# Altium footprint library PcbLib3.PcbLib: 13 footprints
Each footprint in its own frame and in the unit in brackets; x right, y up, seen from the top. Pads: shape width x height; smd on the part's side, far side on the other; paste and mask are expansions set on the pad; w line width, h text height; cw(c..) or ccw(c..) is an arc to the next point about the centre after c.
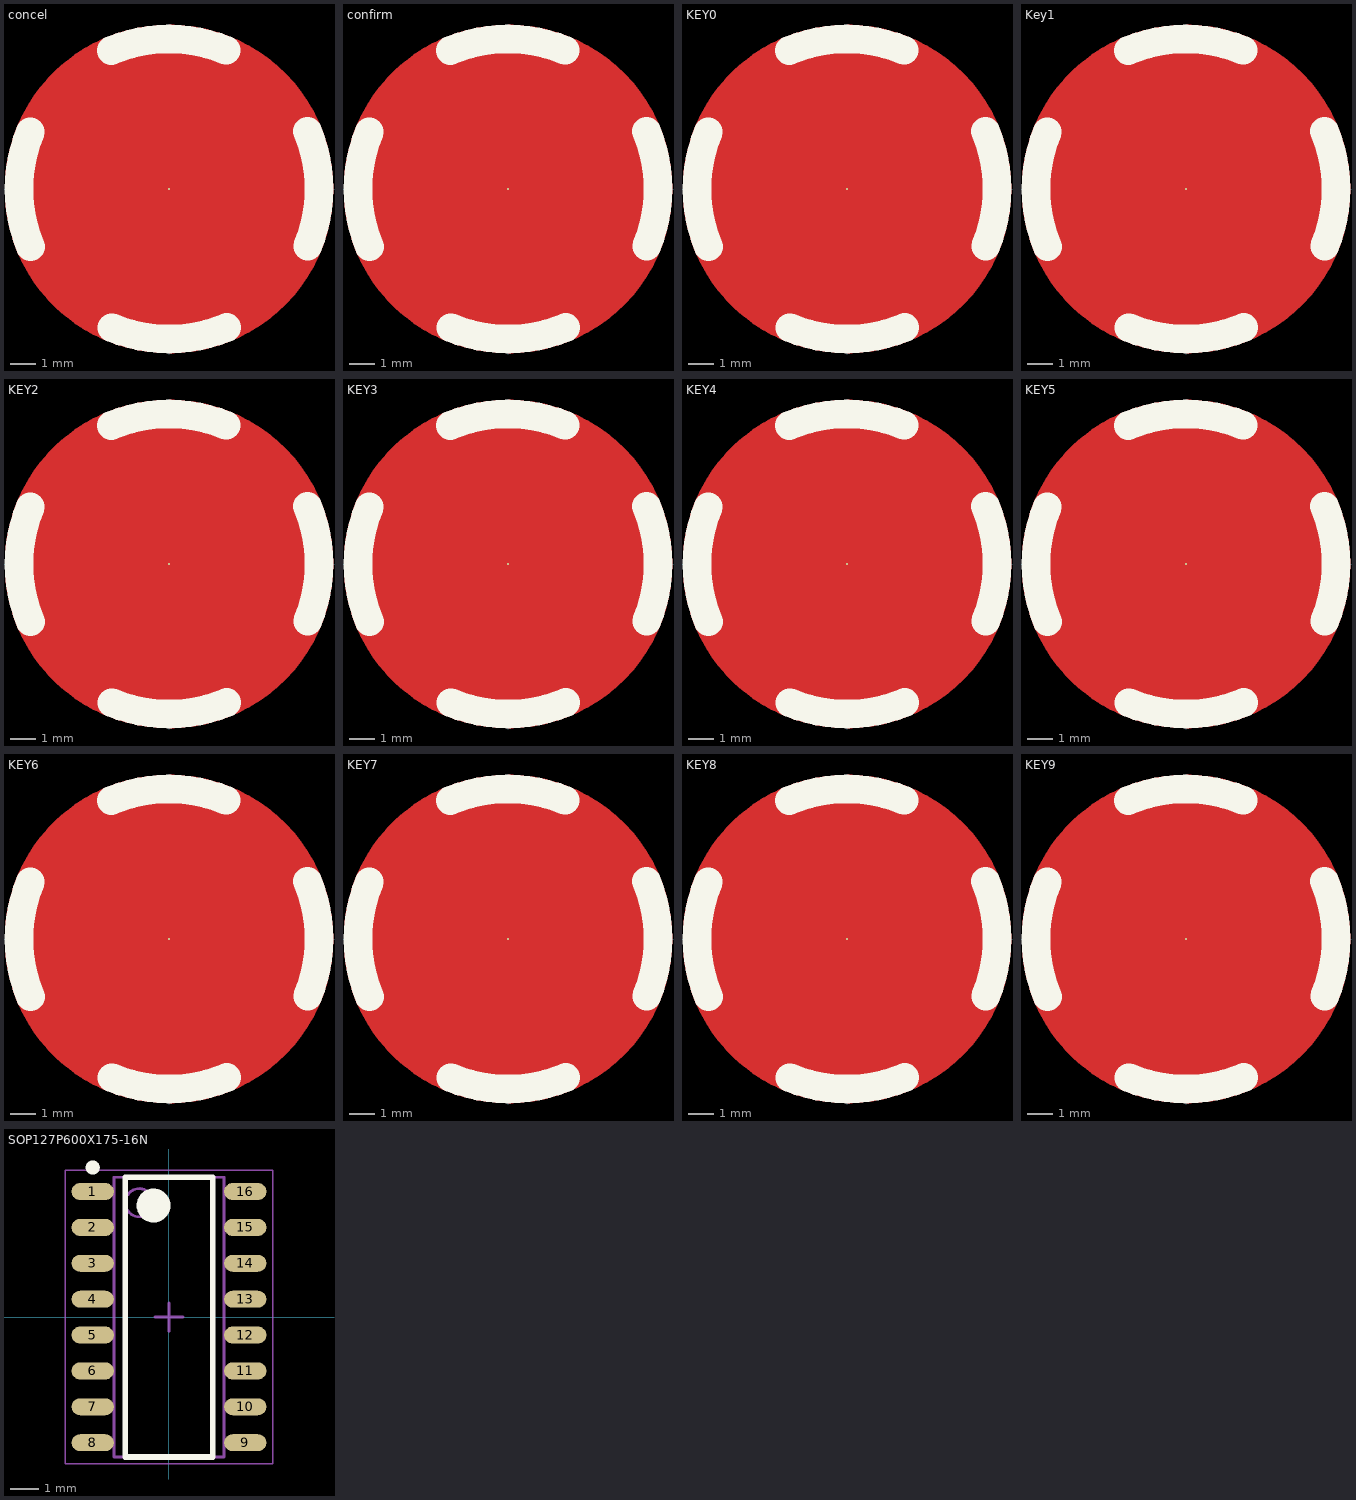
[diagram p0: the footprints below, top view; thin cyan lines are the x and y axes]

## concel [mm]
pads (1):
  round 0.1 smd: 1(0,0)
Top Layer:
  circle w1.143: c0,0 r6
  region: 0,-6 -0.295,-6 -0.881,-5.942 -1.46,-5.827 -2.024,-5.656 -2.568,-5.43 -3.088,-5.153 -3.579,-4.825 -4.034,-4.451 -4.451,-4.034 -4.825,-3.579 -5.153,-3.088 -5.43,-2.568 -5.656,-2.024 -5.827,-1.46 -5.942,-0.881 -6,-0.295 -6,0 -6,0.295 -5.942,0.881 -5.827,1.46 -5.656,2.024 -5.43,2.568 -5.153,3.088 -4.825,3.579 -4.451,4.034 -4.034,4.451 -3.579,4.825 -3.088,5.153 -2.568,5.43 -2.024,5.656 -1.46,5.827 -0.881,5.942 -0.295,6 0,6 0.295,6 0.881,5.942 1.46,5.827 2.024,5.656 2.568,5.43 3.088,5.153 3.579,4.825 4.034,4.451 4.451,4.034 4.825,3.579 5.153,3.088 5.43,2.568 5.656,2.024 5.827,1.46 5.942,0.881 6,0.295 6,0 6,-0.295 5.942,-0.881 5.827,-1.46 5.656,-2.024 5.43,-2.568 5.153,-3.088 4.825,-3.579 4.451,-4.034 4.034,-4.451 3.579,-4.825 3.088,-5.153 2.568,-5.43 2.024,-5.656 1.46,-5.827 0.881,-5.942 0.295,-6
Top Overlay:
  lines w1.143: -5.543,2.296 ccw(c0,0) -5.541,-2.302 ; -2.302,5.541 cw(c0,0) 2.296,5.543 ; -2.296,-5.543 ccw(c0,0) 2.302,-5.541 ; 5.541,2.302 cw(c0,0) 5.543,-2.296
Top Solder:
  text "归零" at -4.462,-1.107 h6

## confirm [mm]
pads (1):
  round 0.1 smd: 1(0,0)
Top Layer:
  circle w1.143: c0,0 r6
  region: 0,-6 -0.295,-6 -0.881,-5.942 -1.46,-5.827 -2.024,-5.656 -2.568,-5.43 -3.088,-5.153 -3.579,-4.825 -4.034,-4.451 -4.451,-4.034 -4.825,-3.579 -5.153,-3.088 -5.43,-2.568 -5.656,-2.024 -5.827,-1.46 -5.942,-0.881 -6,-0.295 -6,0 -6,0.295 -5.942,0.881 -5.827,1.46 -5.656,2.024 -5.43,2.568 -5.153,3.088 -4.825,3.579 -4.451,4.034 -4.034,4.451 -3.579,4.825 -3.088,5.153 -2.568,5.43 -2.024,5.656 -1.46,5.827 -0.881,5.942 -0.295,6 0,6 0.295,6 0.881,5.942 1.46,5.827 2.024,5.656 2.568,5.43 3.088,5.153 3.579,4.825 4.034,4.451 4.451,4.034 4.825,3.579 5.153,3.088 5.43,2.568 5.656,2.024 5.827,1.46 5.942,0.881 6,0.295 6,0 6,-0.295 5.942,-0.881 5.827,-1.46 5.656,-2.024 5.43,-2.568 5.153,-3.088 4.825,-3.579 4.451,-4.034 4.034,-4.451 3.579,-4.825 3.088,-5.153 2.568,-5.43 2.024,-5.656 1.46,-5.827 0.881,-5.942 0.295,-6
Top Overlay:
  lines w1.143: -5.543,2.296 ccw(c0,0) -5.541,-2.302 ; -2.302,5.541 cw(c0,0) 2.296,5.543 ; -2.296,-5.543 ccw(c0,0) 2.302,-5.541 ; 5.541,2.302 cw(c0,0) 5.543,-2.296
Top Solder:
  text "确认" at -4.445,-1.318 h6

## KEY0 [mm]
pads (1):
  round 0.1 smd: 1(0,0)
Top Layer:
  circle w1.143: c0,0 r6
  region: 0,-6 -0.295,-6 -0.881,-5.942 -1.46,-5.827 -2.024,-5.656 -2.568,-5.43 -3.088,-5.153 -3.579,-4.825 -4.034,-4.451 -4.451,-4.034 -4.825,-3.579 -5.153,-3.088 -5.43,-2.568 -5.656,-2.024 -5.827,-1.46 -5.942,-0.881 -6,-0.295 -6,0 -6,0.295 -5.942,0.881 -5.827,1.46 -5.656,2.024 -5.43,2.568 -5.153,3.088 -4.825,3.579 -4.451,4.034 -4.034,4.451 -3.579,4.825 -3.088,5.153 -2.568,5.43 -2.024,5.656 -1.46,5.827 -0.881,5.942 -0.295,6 0,6 0.295,6 0.881,5.942 1.46,5.827 2.024,5.656 2.568,5.43 3.088,5.153 3.579,4.825 4.034,4.451 4.451,4.034 4.825,3.579 5.153,3.088 5.43,2.568 5.656,2.024 5.827,1.46 5.942,0.881 6,0.295 6,0 6,-0.295 5.942,-0.881 5.827,-1.46 5.656,-2.024 5.43,-2.568 5.153,-3.088 4.825,-3.579 4.451,-4.034 4.034,-4.451 3.579,-4.825 3.088,-5.153 2.568,-5.43 2.024,-5.656 1.46,-5.827 0.881,-5.942 0.295,-6
Top Overlay:
  lines w1.143: -5.543,2.296 ccw(c0,0) -5.541,-2.302 ; -2.302,5.541 cw(c0,0) 2.296,5.543 ; -2.296,-5.543 ccw(c0,0) 2.302,-5.541 ; 5.541,2.302 cw(c0,0) 5.543,-2.296
Top Solder:
  text "0" at -2.54,-3.412 h12

## Key1 [mm]
pads (1):
  round 0.1 smd: 1(0,0)
Top Layer:
  circle w1.143: c0,0 r6
  region: 0,-6 -0.295,-6 -0.881,-5.942 -1.46,-5.827 -2.024,-5.656 -2.568,-5.43 -3.088,-5.153 -3.579,-4.825 -4.034,-4.451 -4.451,-4.034 -4.825,-3.579 -5.153,-3.088 -5.43,-2.568 -5.656,-2.024 -5.827,-1.46 -5.942,-0.881 -6,-0.295 -6,0 -6,0.295 -5.942,0.881 -5.827,1.46 -5.656,2.024 -5.43,2.568 -5.153,3.088 -4.825,3.579 -4.451,4.034 -4.034,4.451 -3.579,4.825 -3.088,5.153 -2.568,5.43 -2.024,5.656 -1.46,5.827 -0.881,5.942 -0.295,6 0,6 0.295,6 0.881,5.942 1.46,5.827 2.024,5.656 2.568,5.43 3.088,5.153 3.579,4.825 4.034,4.451 4.451,4.034 4.825,3.579 5.153,3.088 5.43,2.568 5.656,2.024 5.827,1.46 5.942,0.881 6,0.295 6,0 6,-0.295 5.942,-0.881 5.827,-1.46 5.656,-2.024 5.43,-2.568 5.153,-3.088 4.825,-3.579 4.451,-4.034 4.034,-4.451 3.579,-4.825 3.088,-5.153 2.568,-5.43 2.024,-5.656 1.46,-5.827 0.881,-5.942 0.295,-6
Top Overlay:
  lines w1.143: -5.543,2.296 ccw(c0,0) -5.541,-2.302 ; -2.302,5.541 cw(c0,0) 2.296,5.543 ; -2.296,-5.543 ccw(c0,0) 2.302,-5.541 ; 5.541,2.302 cw(c0,0) 5.543,-2.296
Top Solder:
  text "1" at -2.54,-3.556 h12

## KEY2 [mm]
pads (1):
  round 0.1 smd: 1(0,0)
Top Layer:
  circle w1.143: c0,0 r6
  region: 0,-6 -0.295,-6 -0.881,-5.942 -1.46,-5.827 -2.024,-5.656 -2.568,-5.43 -3.088,-5.153 -3.579,-4.825 -4.034,-4.451 -4.451,-4.034 -4.825,-3.579 -5.153,-3.088 -5.43,-2.568 -5.656,-2.024 -5.827,-1.46 -5.942,-0.881 -6,-0.295 -6,0 -6,0.295 -5.942,0.881 -5.827,1.46 -5.656,2.024 -5.43,2.568 -5.153,3.088 -4.825,3.579 -4.451,4.034 -4.034,4.451 -3.579,4.825 -3.088,5.153 -2.568,5.43 -2.024,5.656 -1.46,5.827 -0.881,5.942 -0.295,6 0,6 0.295,6 0.881,5.942 1.46,5.827 2.024,5.656 2.568,5.43 3.088,5.153 3.579,4.825 4.034,4.451 4.451,4.034 4.825,3.579 5.153,3.088 5.43,2.568 5.656,2.024 5.827,1.46 5.942,0.881 6,0.295 6,0 6,-0.295 5.942,-0.881 5.827,-1.46 5.656,-2.024 5.43,-2.568 5.153,-3.088 4.825,-3.579 4.451,-4.034 4.034,-4.451 3.579,-4.825 3.088,-5.153 2.568,-5.43 2.024,-5.656 1.46,-5.827 0.881,-5.942 0.295,-6
Top Overlay:
  lines w1.143: -5.543,2.296 ccw(c0,0) -5.541,-2.302 ; -2.302,5.541 cw(c0,0) 2.296,5.543 ; -2.296,-5.543 ccw(c0,0) 2.302,-5.541 ; 5.541,2.302 cw(c0,0) 5.543,-2.296
Top Solder:
  text "2" at -2.54,-3.556 h12

## KEY3 [mm]
pads (1):
  round 0.1 smd: 1(0,0)
Top Layer:
  circle w1.143: c0,0 r6
  region: 0,-6 -0.295,-6 -0.881,-5.942 -1.46,-5.827 -2.024,-5.656 -2.568,-5.43 -3.088,-5.153 -3.579,-4.825 -4.034,-4.451 -4.451,-4.034 -4.825,-3.579 -5.153,-3.088 -5.43,-2.568 -5.656,-2.024 -5.827,-1.46 -5.942,-0.881 -6,-0.295 -6,0 -6,0.295 -5.942,0.881 -5.827,1.46 -5.656,2.024 -5.43,2.568 -5.153,3.088 -4.825,3.579 -4.451,4.034 -4.034,4.451 -3.579,4.825 -3.088,5.153 -2.568,5.43 -2.024,5.656 -1.46,5.827 -0.881,5.942 -0.295,6 0,6 0.295,6 0.881,5.942 1.46,5.827 2.024,5.656 2.568,5.43 3.088,5.153 3.579,4.825 4.034,4.451 4.451,4.034 4.825,3.579 5.153,3.088 5.43,2.568 5.656,2.024 5.827,1.46 5.942,0.881 6,0.295 6,0 6,-0.295 5.942,-0.881 5.827,-1.46 5.656,-2.024 5.43,-2.568 5.153,-3.088 4.825,-3.579 4.451,-4.034 4.034,-4.451 3.579,-4.825 3.088,-5.153 2.568,-5.43 2.024,-5.656 1.46,-5.827 0.881,-5.942 0.295,-6
Top Overlay:
  lines w1.143: -5.543,2.296 ccw(c0,0) -5.541,-2.302 ; -2.302,5.541 cw(c0,0) 2.296,5.543 ; -2.296,-5.543 ccw(c0,0) 2.302,-5.541 ; 5.541,2.302 cw(c0,0) 5.543,-2.296
Top Solder:
  text "3" at -2.54,-3.412 h12

## KEY4 [mm]
pads (1):
  round 0.1 smd: 1(0,0)
Top Layer:
  circle w1.143: c0,0 r6
  region: 0,-6 -0.295,-6 -0.881,-5.942 -1.46,-5.827 -2.024,-5.656 -2.568,-5.43 -3.088,-5.153 -3.579,-4.825 -4.034,-4.451 -4.451,-4.034 -4.825,-3.579 -5.153,-3.088 -5.43,-2.568 -5.656,-2.024 -5.827,-1.46 -5.942,-0.881 -6,-0.295 -6,0 -6,0.295 -5.942,0.881 -5.827,1.46 -5.656,2.024 -5.43,2.568 -5.153,3.088 -4.825,3.579 -4.451,4.034 -4.034,4.451 -3.579,4.825 -3.088,5.153 -2.568,5.43 -2.024,5.656 -1.46,5.827 -0.881,5.942 -0.295,6 0,6 0.295,6 0.881,5.942 1.46,5.827 2.024,5.656 2.568,5.43 3.088,5.153 3.579,4.825 4.034,4.451 4.451,4.034 4.825,3.579 5.153,3.088 5.43,2.568 5.656,2.024 5.827,1.46 5.942,0.881 6,0.295 6,0 6,-0.295 5.942,-0.881 5.827,-1.46 5.656,-2.024 5.43,-2.568 5.153,-3.088 4.825,-3.579 4.451,-4.034 4.034,-4.451 3.579,-4.825 3.088,-5.153 2.568,-5.43 2.024,-5.656 1.46,-5.827 0.881,-5.942 0.295,-6
Top Overlay:
  lines w1.143: -5.543,2.296 ccw(c0,0) -5.541,-2.302 ; -2.302,5.541 cw(c0,0) 2.296,5.543 ; -2.296,-5.543 ccw(c0,0) 2.302,-5.541 ; 5.541,2.302 cw(c0,0) 5.543,-2.296
Top Solder:
  text "4" at -2.54,-3.556 h12

## KEY5 [mm]
pads (1):
  round 0.1 smd: 1(0,0)
Top Layer:
  circle w1.143: c0,0 r6
  region: 0,-6 -0.295,-6 -0.881,-5.942 -1.46,-5.827 -2.024,-5.656 -2.568,-5.43 -3.088,-5.153 -3.579,-4.825 -4.034,-4.451 -4.451,-4.034 -4.825,-3.579 -5.153,-3.088 -5.43,-2.568 -5.656,-2.024 -5.827,-1.46 -5.942,-0.881 -6,-0.295 -6,0 -6,0.295 -5.942,0.881 -5.827,1.46 -5.656,2.024 -5.43,2.568 -5.153,3.088 -4.825,3.579 -4.451,4.034 -4.034,4.451 -3.579,4.825 -3.088,5.153 -2.568,5.43 -2.024,5.656 -1.46,5.827 -0.881,5.942 -0.295,6 0,6 0.295,6 0.881,5.942 1.46,5.827 2.024,5.656 2.568,5.43 3.088,5.153 3.579,4.825 4.034,4.451 4.451,4.034 4.825,3.579 5.153,3.088 5.43,2.568 5.656,2.024 5.827,1.46 5.942,0.881 6,0.295 6,0 6,-0.295 5.942,-0.881 5.827,-1.46 5.656,-2.024 5.43,-2.568 5.153,-3.088 4.825,-3.579 4.451,-4.034 4.034,-4.451 3.579,-4.825 3.088,-5.153 2.568,-5.43 2.024,-5.656 1.46,-5.827 0.881,-5.942 0.295,-6
Top Overlay:
  lines w1.143: -5.543,2.296 ccw(c0,0) -5.541,-2.302 ; -2.302,5.541 cw(c0,0) 2.296,5.543 ; -2.296,-5.543 ccw(c0,0) 2.302,-5.541 ; 5.541,2.302 cw(c0,0) 5.543,-2.296
Top Solder:
  text "5" at -2.54,-3.412 h12

## KEY6 [mm]
pads (1):
  round 0.1 smd: 1(0,0)
Top Layer:
  circle w1.143: c0,0 r6
  region: 0,-6 -0.295,-6 -0.881,-5.942 -1.46,-5.827 -2.024,-5.656 -2.568,-5.43 -3.088,-5.153 -3.579,-4.825 -4.034,-4.451 -4.451,-4.034 -4.825,-3.579 -5.153,-3.088 -5.43,-2.568 -5.656,-2.024 -5.827,-1.46 -5.942,-0.881 -6,-0.295 -6,0 -6,0.295 -5.942,0.881 -5.827,1.46 -5.656,2.024 -5.43,2.568 -5.153,3.088 -4.825,3.579 -4.451,4.034 -4.034,4.451 -3.579,4.825 -3.088,5.153 -2.568,5.43 -2.024,5.656 -1.46,5.827 -0.881,5.942 -0.295,6 0,6 0.295,6 0.881,5.942 1.46,5.827 2.024,5.656 2.568,5.43 3.088,5.153 3.579,4.825 4.034,4.451 4.451,4.034 4.825,3.579 5.153,3.088 5.43,2.568 5.656,2.024 5.827,1.46 5.942,0.881 6,0.295 6,0 6,-0.295 5.942,-0.881 5.827,-1.46 5.656,-2.024 5.43,-2.568 5.153,-3.088 4.825,-3.579 4.451,-4.034 4.034,-4.451 3.579,-4.825 3.088,-5.153 2.568,-5.43 2.024,-5.656 1.46,-5.827 0.881,-5.942 0.295,-6
Top Overlay:
  lines w1.143: -5.543,2.296 ccw(c0,0) -5.541,-2.302 ; -2.302,5.541 cw(c0,0) 2.296,5.543 ; -2.296,-5.543 ccw(c0,0) 2.302,-5.541 ; 5.541,2.302 cw(c0,0) 5.543,-2.296
Top Solder:
  text "6" at -2.54,-3.412 h12

## KEY7 [mm]
pads (1):
  round 0.1 smd: 1(0,0)
Top Layer:
  circle w1.143: c0,0 r6
  region: 0,-6 -0.295,-6 -0.881,-5.942 -1.46,-5.827 -2.024,-5.656 -2.568,-5.43 -3.088,-5.153 -3.579,-4.825 -4.034,-4.451 -4.451,-4.034 -4.825,-3.579 -5.153,-3.088 -5.43,-2.568 -5.656,-2.024 -5.827,-1.46 -5.942,-0.881 -6,-0.295 -6,0 -6,0.295 -5.942,0.881 -5.827,1.46 -5.656,2.024 -5.43,2.568 -5.153,3.088 -4.825,3.579 -4.451,4.034 -4.034,4.451 -3.579,4.825 -3.088,5.153 -2.568,5.43 -2.024,5.656 -1.46,5.827 -0.881,5.942 -0.295,6 0,6 0.295,6 0.881,5.942 1.46,5.827 2.024,5.656 2.568,5.43 3.088,5.153 3.579,4.825 4.034,4.451 4.451,4.034 4.825,3.579 5.153,3.088 5.43,2.568 5.656,2.024 5.827,1.46 5.942,0.881 6,0.295 6,0 6,-0.295 5.942,-0.881 5.827,-1.46 5.656,-2.024 5.43,-2.568 5.153,-3.088 4.825,-3.579 4.451,-4.034 4.034,-4.451 3.579,-4.825 3.088,-5.153 2.568,-5.43 2.024,-5.656 1.46,-5.827 0.881,-5.942 0.295,-6
Top Overlay:
  lines w1.143: -5.543,2.296 ccw(c0,0) -5.541,-2.302 ; -2.302,5.541 cw(c0,0) 2.296,5.543 ; -2.296,-5.543 ccw(c0,0) 2.302,-5.541 ; 5.541,2.302 cw(c0,0) 5.543,-2.296
Top Solder:
  text "7" at -2.54,-3.556 h12

## KEY8 [mm]
pads (1):
  round 0.1 smd: 1(0,0)
Top Layer:
  circle w1.143: c0,0 r6
  region: 0,-6 -0.295,-6 -0.881,-5.942 -1.46,-5.827 -2.024,-5.656 -2.568,-5.43 -3.088,-5.153 -3.579,-4.825 -4.034,-4.451 -4.451,-4.034 -4.825,-3.579 -5.153,-3.088 -5.43,-2.568 -5.656,-2.024 -5.827,-1.46 -5.942,-0.881 -6,-0.295 -6,0 -6,0.295 -5.942,0.881 -5.827,1.46 -5.656,2.024 -5.43,2.568 -5.153,3.088 -4.825,3.579 -4.451,4.034 -4.034,4.451 -3.579,4.825 -3.088,5.153 -2.568,5.43 -2.024,5.656 -1.46,5.827 -0.881,5.942 -0.295,6 0,6 0.295,6 0.881,5.942 1.46,5.827 2.024,5.656 2.568,5.43 3.088,5.153 3.579,4.825 4.034,4.451 4.451,4.034 4.825,3.579 5.153,3.088 5.43,2.568 5.656,2.024 5.827,1.46 5.942,0.881 6,0.295 6,0 6,-0.295 5.942,-0.881 5.827,-1.46 5.656,-2.024 5.43,-2.568 5.153,-3.088 4.825,-3.579 4.451,-4.034 4.034,-4.451 3.579,-4.825 3.088,-5.153 2.568,-5.43 2.024,-5.656 1.46,-5.827 0.881,-5.942 0.295,-6
Top Overlay:
  lines w1.143: -5.543,2.296 ccw(c0,0) -5.541,-2.302 ; -2.302,5.541 cw(c0,0) 2.296,5.543 ; -2.296,-5.543 ccw(c0,0) 2.302,-5.541 ; 5.541,2.302 cw(c0,0) 5.543,-2.296
Top Solder:
  text "8" at -2.54,-3.412 h12

## KEY9 [mm]
pads (1):
  round 0.1 smd: 1(0,0)
Top Layer:
  circle w1.143: c0,0 r6
  region: 0,-6 -0.295,-6 -0.881,-5.942 -1.46,-5.827 -2.024,-5.656 -2.568,-5.43 -3.088,-5.153 -3.579,-4.825 -4.034,-4.451 -4.451,-4.034 -4.825,-3.579 -5.153,-3.088 -5.43,-2.568 -5.656,-2.024 -5.827,-1.46 -5.942,-0.881 -6,-0.295 -6,0 -6,0.295 -5.942,0.881 -5.827,1.46 -5.656,2.024 -5.43,2.568 -5.153,3.088 -4.825,3.579 -4.451,4.034 -4.034,4.451 -3.579,4.825 -3.088,5.153 -2.568,5.43 -2.024,5.656 -1.46,5.827 -0.881,5.942 -0.295,6 0,6 0.295,6 0.881,5.942 1.46,5.827 2.024,5.656 2.568,5.43 3.088,5.153 3.579,4.825 4.034,4.451 4.451,4.034 4.825,3.579 5.153,3.088 5.43,2.568 5.656,2.024 5.827,1.46 5.942,0.881 6,0.295 6,0 6,-0.295 5.942,-0.881 5.827,-1.46 5.656,-2.024 5.43,-2.568 5.153,-3.088 4.825,-3.579 4.451,-4.034 4.034,-4.451 3.579,-4.825 3.088,-5.153 2.568,-5.43 2.024,-5.656 1.46,-5.827 0.881,-5.942 0.295,-6
Top Overlay:
  lines w1.143: -5.543,2.296 ccw(c0,0) -5.541,-2.302 ; -2.302,5.541 cw(c0,0) 2.296,5.543 ; -2.296,-5.543 ccw(c0,0) 2.302,-5.541 ; 5.541,2.302 cw(c0,0) 5.543,-2.296
Top Solder:
  text "9" at -2.54,-3.412 h12

## SOP127P600X175-16N [mm] "SOP, 16-Leads, Body 9.90x3.90mm, Pitch 1.27mm, IPC Medium Density"
height 1.75
pads (16):
  oval 1.5x0.6 smd: 1(-2.7,4.445) 2(-2.7,3.175) 3(-2.7,1.905) 4(-2.7,0.635) 5(-2.7,-0.635) 6(-2.7,-1.905) 7(-2.7,-3.175) 8(-2.7,-4.445) 9(2.7,-4.445) 10(2.7,-3.175) 11(2.7,-1.905) 12(2.7,-0.635) 13(2.7,0.635) 14(2.7,1.905) 15(2.7,3.175) 16(2.7,4.445)
Top Overlay:
  circle w0.25: c-2.7,5.295 r0.125
  circle w0.6: c-0.55,3.95 r0.3
  lines w0.2: -1.55,-4.95 -1.55,4.95 1.55,4.95 1.55,-4.95 -1.55,-4.95
Mechanical 13:
  circle w0.1: c-1.05,4.05 r0.5
  lines w0.1: -1.95,-4.95 -1.95,4.95 1.95,4.95 1.95,-4.95 -1.95,-4.95
Mechanical 15:
  lines w0.05: -3.675,-5.2 -3.675,5.2 3.675,5.2 3.675,-5.2 -3.675,-5.2
  lines w0.1: -0.5,0 0.5,0 ; 0,-0.5 0,0.5
3D body "SOP127P600X175-16N.step": height 1.75, standoff 0, extent -3,-4.95 3,4.95